# Altium footprint library Switches.PcbLib: 117 footprints (part 7 of 8) (continued)
## SW_OMRON_A6SN-1101 [mm] "Body 4.48x7.5mm, 1 Way SPST Surface-Mounting Slide Switch With Flat Actuator (A6SN Series)"
height 4.6
pads (2):
  rect 2.15x1.1 smd: 1(-4.125,0) 2(4.125,0)
Top Overlay:
  lines w0.2: -3.75,-0.95 -3.75,-2.49 3.75,-2.49 3.75,-0.95 ; -3.75,0.95 -3.75,2.49 3.75,2.49 3.75,0.95 ; -1.578,-1.05 -1.578,1.05 ; -1.378,-1.05 -1.378,1.05 ; -1.178,-1.05 -1.178,1.05 ; -0.978,-1.05 -0.978,1.05 ; -0.778,-1.05 -0.778,1.05 ; -0.578,-1.05 -0.578,1.05 ; -0.378,-1.05 -0.378,1.05 ; -0.178,-1.05 -0.178,1.05 ; -0.025,-1.05 -0.025,1.05 ; -2.225,-1.05 2.225,-1.05 2.225,1.05 -2.225,1.05 -2.225,-1.05
Mechanical 8:
  lines w0.1: -4.625,0 -4.125,0 ; -4.125,-0.5 -4.125,0 ; -4.125,0.5 -4.125,0 ; -3.625,0 -4.125,0 ; -0.5,0 0,0 ; 0,-0.5 0,0 ; 0,0.5 0,0 ; 0.5,0 0,0 ; 3.625,0 4.125,0 ; 4.125,-0.5 4.125,0 ; 4.125,0.5 4.125,0 ; 4.625,0 4.125,0 ; -5.2,-0.55 -3.05,-0.55 -3.05,0.55 -5.2,0.55 -5.2,-0.55 ; 3.05,-0.55 5.2,-0.55 5.2,0.55 3.05,0.55 3.05,-0.55
Mechanical 14:
  lines w0.1: -3.75,-0.8 -4.226,-0.8 -4.25,-0.3 -4.65,-0.3 -4.65,0.3 -4.25,0.3 -4.226,0.8 -3.75,0.8 ; -1.578,-1.05 -1.578,1.05 ; -1.478,-1.05 -1.478,1.05 ; -1.378,-1.05 -1.378,1.05 ; -1.278,-1.05 -1.278,1.05 ; -1.178,-1.05 -1.178,1.05 ; -1.078,-1.05 -1.078,1.05 ; -0.978,-1.05 -0.978,1.05 ; -0.878,-1.05 -0.878,1.05 ; -0.778,-1.05 -0.778,1.05 ; -0.678,-1.05 -0.678,1.05 ; -0.578,-1.05 -0.578,1.05 ; -0.478,-1.05 -0.478,1.05 ; -0.378,-1.05 -0.378,1.05 ; -0.278,-1.05 -0.278,1.05 ; -0.178,-1.05 -0.178,1.05 ; -0.078,-1.05 -0.078,1.05 ; -0.025,-1.05 -0.025,1.05 ; 3.75,-0.8 4.226,-0.8 4.25,-0.3 4.65,-0.3 4.65,0.3 4.25,0.3 4.226,0.8 3.75,0.8 ; 3.75,0.55 4.226,0.55 ; -3.75,-2.49 -3.75,2.49 3.75,2.49 3.75,-2.49 -3.75,-2.49 ; -2.225,-1.05 -2.225,1.05 2.225,1.05 2.225,-1.05 -2.225,-1.05
  text "ON" at 2.54,0.889 h1
Mechanical 15:
  lines w0.05: -5.45,-1.05 -4,-1.05 -4,-2.74 4,-2.74 4,-1.05 5.45,-1.05 5.45,1.05 4,1.05 4,2.74 -4,2.74 -4,1.05 -5.45,1.05 -5.45,-1.05
3D body "SW_OMRON_A6SN-1101.stp": height 4.6, standoff 0, extent -4.65,-2.49 4.65,2.49

## SW_OMRON_A6SN-2101 [mm] "Pitch 2.54mm, Body 7x7.5, 2 Ways SPST Surface-Mounting Slide Switch With Flat Actuator (A6SN Series)"
height 4.6
pads (4):
  rect 2.15x1.1 smd: 1(-4.125,1.27) 2(-4.125,-1.27) 3(4.125,-1.27) 4(4.125,1.27)
Top Overlay:
  lines w0.2: -3.75,-2.22 -3.75,-3.76 3.75,-3.76 3.75,-2.22 ; -3.75,2.22 -3.75,3.76 3.75,3.76 3.75,2.22 ; -1.578,-2.32 -1.578,-0.22 ; -1.578,0.22 -1.578,2.32 ; -1.378,-2.32 -1.378,-0.22 ; -1.378,0.22 -1.378,2.32 ; -1.178,-2.32 -1.178,-0.22 ; -1.178,0.22 -1.178,2.32 ; -0.978,-2.32 -0.978,-0.22 ; -0.978,0.22 -0.978,2.32 ; -0.778,-2.32 -0.778,-0.22 ; -0.778,0.22 -0.778,2.32 ; -0.578,-2.32 -0.578,-0.22 ; -0.578,0.22 -0.578,2.32 ; -0.378,-2.32 -0.378,-0.22 ; -0.378,0.22 -0.378,2.32 ; -0.178,-2.32 -0.178,-0.22 ; -0.178,0.22 -0.178,2.32 ; -0.025,-2.32 -0.025,-0.22 ; -0.025,0.22 -0.025,2.32 ; -2.225,-2.32 2.225,-2.32 2.225,-0.22 -2.225,-0.22 -2.225,-2.32 ; -2.225,0.22 2.225,0.22 2.225,2.32 -2.225,2.32 -2.225,0.22
  text "1" at -3.175,3.175 h1
  text "2" at -3.175,-2.699 h1
Mechanical 8:
  lines w0.05: -4.625,-1.27 -4.125,-1.27 ; -4.625,1.27 -4.125,1.27 ; -4.125,-1.77 -4.125,-1.27 ; -4.125,-0.77 -4.125,-1.27 ; -4.125,0.77 -4.125,1.27 ; -4.125,1.77 -4.125,1.27 ; -3.625,-1.27 -4.125,-1.27 ; -3.625,1.27 -4.125,1.27 ; -0.5,-1.27 0,-1.27 ; -0.5,0 0,0 ; -0.5,1.27 0,1.27 ; 0,-1.77 0,-1.27 ; 0,-0.77 0,-1.27 ; 0,-0.5 0,0 ; 0,0.5 0,0 ; 0,0.77 0,1.27 ; 0,1.77 0,1.27 ; 0.5,-1.27 0,-1.27 ; 0.5,0 0,0 ; 0.5,1.27 0,1.27 ; 3.625,-1.27 4.125,-1.27 ; 3.625,1.27 4.125,1.27 ; 4.125,-1.77 4.125,-1.27 ; 4.125,-0.77 4.125,-1.27 ; 4.125,0.77 4.125,1.27 ; 4.125,1.77 4.125,1.27 ; 4.625,-1.27 4.125,-1.27 ; 4.625,1.27 4.125,1.27 ; -5.2,-1.82 -5.2,-0.72 -3.05,-0.72 -3.05,-1.82 -5.2,-1.82 ; -5.2,0.72 -5.2,1.82 -3.05,1.82 -3.05,0.72 -5.2,0.72 ; 3.05,-1.82 3.05,-0.72 5.2,-0.72 5.2,-1.82 3.05,-1.82 ; 3.05,0.72 3.05,1.82 5.2,1.82 5.2,0.72 3.05,0.72
Mechanical 14:
  lines w0.1: -3.75,-2.07 -4.226,-2.07 -4.25,-1.57 -4.65,-1.57 -4.65,-0.97 -4.25,-0.97 -4.226,-0.47 -3.75,-0.47 ; -3.75,0.47 -4.226,0.47 -4.25,0.97 -4.65,0.97 -4.65,1.57 -4.25,1.57 -4.226,2.07 -3.75,2.07 ; -1.578,-2.32 -1.578,-0.22 ; -1.578,0.22 -1.578,2.32 ; -1.478,-2.32 -1.478,-0.22 ; -1.478,0.22 -1.478,2.32 ; -1.378,-2.32 -1.378,-0.22 ; -1.378,0.22 -1.378,2.32 ; -1.278,-2.32 -1.278,-0.22 ; -1.278,0.22 -1.278,2.32 ; -1.178,-2.32 -1.178,-0.22 ; -1.178,0.22 -1.178,2.32 ; -1.078,-2.32 -1.078,-0.22 ; -1.078,0.22 -1.078,2.32 ; -0.978,-2.32 -0.978,-0.22 ; -0.978,0.22 -0.978,2.32 ; -0.878,-2.32 -0.878,-0.22 ; -0.878,0.22 -0.878,2.32 ; -0.778,-2.32 -0.778,-0.22 ; -0.778,0.22 -0.778,2.32 ; -0.678,-2.32 -0.678,-0.22 ; -0.678,0.22 -0.678,2.32 ; -0.578,-2.32 -0.578,-0.22 ; -0.578,0.22 -0.578,2.32 ; -0.478,-2.32 -0.478,-0.22 ; -0.478,0.22 -0.478,2.32 ; -0.378,-2.32 -0.378,-0.22 ; -0.378,0.22 -0.378,2.32 ; -0.278,-2.32 -0.278,-0.22 ; -0.278,0.22 -0.278,2.32 ; -0.178,-2.32 -0.178,-0.22 ; -0.178,0.22 -0.178,2.32 ; -0.078,-2.32 -0.078,-0.22 ; -0.078,0.22 -0.078,2.32 ; -0.025,-2.32 -0.025,-0.22 ; -0.025,0.22 -0.025,2.32 ; 3.75,-2.07 4.226,-2.07 4.25,-1.57 4.65,-1.57 4.65,-0.97 4.25,-0.97 4.226,-0.47 3.75,-0.47 ; 3.75,-0.72 4.226,-0.72 ; 3.75,0.47 4.226,0.47 4.25,0.97 4.65,0.97 4.65,1.57 4.25,1.57 4.226,2.07 3.75,2.07 ; 3.75,1.82 4.226,1.82 ; -3.75,-3.76 3.75,-3.76 3.75,3.76 -3.75,3.76 -3.75,-3.76 ; -2.225,-2.32 2.225,-2.32 2.225,-0.22 -2.225,-0.22 -2.225,-2.32 ; -2.225,0.22 2.225,0.22 2.225,2.32 -2.225,2.32 -2.225,0.22
  text "1" at -3.175,3.175 h1
  text "2" at -3.175,-2.699 h1
Mechanical 15:
  lines w0.05: -5.45,-2.32 -5.45,2.32 -4,2.32 -4,4.01 4,4.01 4,2.32 5.45,2.32 5.45,-2.32 4,-2.32 4,-4.01 -4,-4.01 -4,-2.32 -5.45,-2.32
3D body "SW_OMRON_A6SN-2101.stp": height 4.6, standoff 0, extent -4.65,-3.76 4.65,3.76

## SW_OMRON_A6SN-3101 [mm] "Pitch 2.54mm, Body 9.6x7.5, 3 Ways SPST Surface-Mounting Slide Switch With Flat Actuator (A6SN Series)witch With Flat Actuator (A6SN Series)"
height 4.6
pads (6):
  rect 2.15x1.1 smd: 1(-4.125,2.54) 2(-4.125,0) 3(-4.125,-2.54) 4(4.125,-2.54) 5(4.125,0) 6(4.125,2.54)
Top Overlay:
  lines w0.2: -3.75,-3.49 -3.75,-5.03 3.75,-5.03 3.75,-3.49 ; -3.75,3.49 -3.75,5.03 3.75,5.03 3.75,3.49 ; -1.578,-3.59 -1.578,-1.49 ; -1.578,-1.05 -1.578,1.05 ; -1.578,1.49 -1.578,3.59 ; -1.378,-3.59 -1.378,-1.49 ; -1.378,-1.05 -1.378,1.05 ; -1.378,1.49 -1.378,3.59 ; -1.178,-3.59 -1.178,-1.49 ; -1.178,-1.05 -1.178,1.05 ; -1.178,1.49 -1.178,3.59 ; -0.978,-3.59 -0.978,-1.49 ; -0.978,-1.05 -0.978,1.05 ; -0.978,1.49 -0.978,3.59 ; -0.778,-3.59 -0.778,-1.49 ; -0.778,-1.05 -0.778,1.05 ; -0.778,1.49 -0.778,3.59 ; -0.578,-3.59 -0.578,-1.49 ; -0.578,-1.05 -0.578,1.05 ; -0.578,1.49 -0.578,3.59 ; -0.378,-3.59 -0.378,-1.49 ; -0.378,-1.05 -0.378,1.05 ; -0.378,1.49 -0.378,3.59 ; -0.178,-3.59 -0.178,-1.49 ; -0.178,-1.05 -0.178,1.05 ; -0.178,1.49 -0.178,3.59 ; -0.025,-3.59 -0.025,-1.49 ; -0.025,-1.05 -0.025,1.05 ; -0.025,1.49 -0.025,3.59 ; -2.225,-3.59 -2.225,-1.49 2.225,-1.49 2.225,-3.59 -2.225,-3.59 ; -2.225,-1.05 -2.225,1.05 2.225,1.05 2.225,-1.05 -2.225,-1.05 ; -2.225,1.49 -2.225,3.59 2.225,3.59 2.225,1.49 -2.225,1.49
  text "1" at -3.175,4.445 h1
  text "3" at -3.175,-3.969 h1
Mechanical 8:
  lines w0.05: -4.625,-2.54 -4.125,-2.54 ; -4.625,0 -4.125,0 ; -4.625,2.54 -4.125,2.54 ; -4.125,-3.04 -4.125,-2.54 ; -4.125,-2.04 -4.125,-2.54 ; -4.125,-0.5 -4.125,0 ; -4.125,0.5 -4.125,0 ; -4.125,2.04 -4.125,2.54 ; -4.125,3.04 -4.125,2.54 ; -3.625,-2.54 -4.125,-2.54 ; -3.625,0 -4.125,0 ; -3.625,2.54 -4.125,2.54 ; -0.5,-2.54 0,-2.54 ; -0.5,0 0,0 ; -0.5,2.54 0,2.54 ; 0,-3.04 0,-2.54 ; 0,-2.04 0,-2.54 ; 0,-0.5 0,0 ; 0,0.5 0,0 ; 0,2.04 0,2.54 ; 0,3.04 0,2.54 ; 0.5,-2.54 0,-2.54 ; 0.5,0 0,0 ; 0.5,2.54 0,2.54 ; 3.625,-2.54 4.125,-2.54 ; 3.625,0 4.125,0 ; 3.625,2.54 4.125,2.54 ; 4.125,-3.04 4.125,-2.54 ; 4.125,-2.04 4.125,-2.54 ; 4.125,-0.5 4.125,0 ; 4.125,0.5 4.125,0 ; 4.125,2.04 4.125,2.54 ; 4.125,3.04 4.125,2.54 ; 4.625,-2.54 4.125,-2.54 ; 4.625,0 4.125,0 ; 4.625,2.54 4.125,2.54 ; -5.2,-3.09 -3.05,-3.09 -3.05,-1.99 -5.2,-1.99 -5.2,-3.09 ; -5.2,-0.55 -3.05,-0.55 -3.05,0.55 -5.2,0.55 -5.2,-0.55 ; -5.2,1.99 -3.05,1.99 -3.05,3.09 -5.2,3.09 -5.2,1.99 ; 3.05,-3.09 5.2,-3.09 5.2,-1.99 3.05,-1.99 3.05,-3.09 ; 3.05,-0.55 5.2,-0.55 5.2,0.55 3.05,0.55 3.05,-0.55 ; 3.05,1.99 5.2,1.99 5.2,3.09 3.05,3.09 3.05,1.99
Mechanical 14:
  lines w0.1: -3.75,-3.34 -4.226,-3.34 -4.25,-2.84 -4.65,-2.84 -4.65,-2.24 -4.25,-2.24 -4.226,-1.74 -3.75,-1.74 ; -3.75,-0.8 -4.226,-0.8 -4.25,-0.3 -4.65,-0.3 -4.65,0.3 -4.25,0.3 -4.226,0.8 -3.75,0.8 ; -3.75,1.74 -4.226,1.74 -4.25,2.24 -4.65,2.24 -4.65,2.84 -4.25,2.84 -4.226,3.34 -3.75,3.34 ; -1.578,-3.59 -1.578,-1.49 ; -1.578,-1.05 -1.578,1.05 ; -1.578,1.49 -1.578,3.59 ; -1.478,-3.59 -1.478,-1.49 ; -1.478,-1.05 -1.478,1.05 ; -1.478,1.49 -1.478,3.59 ; -1.378,-3.59 -1.378,-1.49 ; -1.378,-1.05 -1.378,1.05 ; -1.378,1.49 -1.378,3.59 ; -1.278,-3.59 -1.278,-1.49 ; -1.278,-1.05 -1.278,1.05 ; -1.278,1.49 -1.278,3.59 ; -1.178,-3.59 -1.178,-1.49 ; -1.178,-1.05 -1.178,1.05 ; -1.178,1.49 -1.178,3.59 ; -1.078,-3.59 -1.078,-1.49 ; -1.078,-1.05 -1.078,1.05 ; -1.078,1.49 -1.078,3.59 ; -0.978,-3.59 -0.978,-1.49 ; -0.978,-1.05 -0.978,1.05 ; -0.978,1.49 -0.978,3.59 ; -0.878,-3.59 -0.878,-1.49 ; -0.878,-1.05 -0.878,1.05 ; -0.878,1.49 -0.878,3.59 ; -0.778,-3.59 -0.778,-1.49 ; -0.778,-1.05 -0.778,1.05 ; -0.778,1.49 -0.778,3.59 ; -0.678,-3.59 -0.678,-1.49 ; -0.678,-1.05 -0.678,1.05 ; -0.678,1.49 -0.678,3.59 ; -0.578,-3.59 -0.578,-1.49 ; -0.578,-1.05 -0.578,1.05 ; -0.578,1.49 -0.578,3.59 ; -0.478,-3.59 -0.478,-1.49 ; -0.478,-1.05 -0.478,1.05 ; -0.478,1.49 -0.478,3.59 ; -0.378,-3.59 -0.378,-1.49 ; -0.378,-1.05 -0.378,1.05 ; -0.378,1.49 -0.378,3.59 ; -0.278,-3.59 -0.278,-1.49 ; -0.278,-1.05 -0.278,1.05 ; -0.278,1.49 -0.278,3.59 ; -0.178,-3.59 -0.178,-1.49 ; -0.178,-1.05 -0.178,1.05 ; -0.178,1.49 -0.178,3.59 ; -0.078,-3.59 -0.078,-1.49 ; -0.078,-1.05 -0.078,1.05 ; -0.078,1.49 -0.078,3.59 ; -0.025,-3.59 -0.025,-1.49 ; -0.025,-1.05 -0.025,1.05 ; -0.025,1.49 -0.025,3.59 ; 3.75,-3.34 4.226,-3.34 4.25,-2.84 4.65,-2.84 4.65,-2.24 4.25,-2.24 4.226,-1.74 3.75,-1.74 ; 3.75,-1.99 4.226,-1.99 ; 3.75,-0.8 4.226,-0.8 4.25,-0.3 4.65,-0.3 4.65,0.3 4.25,0.3 4.226,0.8 3.75,0.8 ; 3.75,0.55 4.226,0.55 ; 3.75,1.74 4.226,1.74 4.25,2.24 4.65,2.24 4.65,2.84 4.25,2.84 4.226,3.34 3.75,3.34 ; 3.75,3.09 4.226,3.09 ; -3.75,-5.03 -3.75,5.03 3.75,5.03 3.75,-5.03 -3.75,-5.03 ; -2.225,-3.59 -2.225,-1.49 2.225,-1.49 2.225,-3.59 -2.225,-3.59 ; -2.225,-1.05 -2.225,1.05 2.225,1.05 2.225,-1.05 -2.225,-1.05 ; -2.225,1.49 -2.225,3.59 2.225,3.59 2.225,1.49 -2.225,1.49
  text "1" at -3.175,4.445 h1
  text "3" at -3.175,-3.969 h1
Mechanical 15:
  lines w0.05: -5.45,-3.59 -4,-3.59 -4,-5.28 4,-5.28 4,-3.59 5.45,-3.59 5.45,3.59 4,3.59 4,5.28 -4,5.28 -4,3.59 -5.45,3.59 -5.45,-3.59
3D body "SW_OMRON_A6SN-3101.stp": height 4.6, standoff 0, extent -4.65,-5.03 4.65,5.03

## SW_OMRON_A6SN-4101 [mm] "Pitch 2.54mm, Body 9.6x7.5, 3 Ways SPST Surface-Mounting Slide Switch With Flat Actuator (A6SN Series)witch With Flat Actuator (A6SN Series)"
height 4.6
pads (8):
  rect 2.15x1.1 smd: 1(-4.125,3.81) 2(-4.125,1.27) 3(-4.125,-1.27) 4(-4.125,-3.81) 5(4.125,-3.81) 6(4.125,-1.27) 7(4.125,1.27) 8(4.125,3.81)
Top Overlay:
  lines w0.2: -3.75,-4.76 -3.75,-6.3 3.75,-6.3 3.75,-4.76 ; -3.75,4.76 -3.75,6.3 3.75,6.3 3.75,4.76 ; -1.578,-4.86 -1.578,-2.76 ; -1.578,-2.32 -1.578,-0.22 ; -1.578,0.22 -1.578,2.32 ; -1.578,2.76 -1.578,4.86 ; -1.378,-4.86 -1.378,-2.76 ; -1.378,-2.32 -1.378,-0.22 ; -1.378,0.22 -1.378,2.32 ; -1.378,2.76 -1.378,4.86 ; -1.178,-4.86 -1.178,-2.76 ; -1.178,-2.32 -1.178,-0.22 ; -1.178,0.22 -1.178,2.32 ; -1.178,2.76 -1.178,4.86 ; -0.978,-4.86 -0.978,-2.76 ; -0.978,-2.32 -0.978,-0.22 ; -0.978,0.22 -0.978,2.32 ; -0.978,2.76 -0.978,4.86 ; -0.778,-4.86 -0.778,-2.76 ; -0.778,-2.32 -0.778,-0.22 ; -0.778,0.22 -0.778,2.32 ; -0.778,2.76 -0.778,4.86 ; -0.578,-4.86 -0.578,-2.76 ; -0.578,-2.32 -0.578,-0.22 ; -0.578,0.22 -0.578,2.32 ; -0.578,2.76 -0.578,4.86 ; -0.378,-4.86 -0.378,-2.76 ; -0.378,-2.32 -0.378,-0.22 ; -0.378,0.22 -0.378,2.32 ; -0.378,2.76 -0.378,4.86 ; -0.178,-4.86 -0.178,-2.76 ; -0.178,-2.32 -0.178,-0.22 ; -0.178,0.22 -0.178,2.32 ; -0.178,2.76 -0.178,4.86 ; -0.025,-4.86 -0.025,-2.76 ; -0.025,-2.32 -0.025,-0.22 ; -0.025,0.22 -0.025,2.32 ; -0.025,2.76 -0.025,4.86 ; -2.225,-4.86 2.225,-4.86 2.225,-2.76 -2.225,-2.76 -2.225,-4.86 ; -2.225,-2.32 -2.225,-0.22 2.225,-0.22 2.225,-2.32 -2.225,-2.32 ; -2.225,0.22 2.225,0.22 2.225,2.32 -2.225,2.32 -2.225,0.22 ; -2.225,2.76 2.225,2.76 2.225,4.86 -2.225,4.86 -2.225,2.76
  text "4" at -3.175,-5.239 h1
  text "1" at -3.175,5.715 h1
Mechanical 8:
  lines w0.05: -4.625,-3.81 -4.125,-3.81 ; -4.625,-1.27 -4.125,-1.27 ; -4.625,1.27 -4.125,1.27 ; -4.625,3.81 -4.125,3.81 ; -4.125,-4.31 -4.125,-3.81 ; -4.125,-3.31 -4.125,-3.81 ; -4.125,-1.77 -4.125,-1.27 ; -4.125,-0.77 -4.125,-1.27 ; -4.125,0.77 -4.125,1.27 ; -4.125,1.77 -4.125,1.27 ; -4.125,3.31 -4.125,3.81 ; -4.125,4.31 -4.125,3.81 ; -3.625,-3.81 -4.125,-3.81 ; -3.625,-1.27 -4.125,-1.27 ; -3.625,1.27 -4.125,1.27 ; -3.625,3.81 -4.125,3.81 ; -0.5,-3.81 0,-3.81 ; -0.5,-1.27 0,-1.27 ; -0.5,1.27 0,1.27 ; -0.5,3.81 0,3.81 ; 0,-4.31 0,-3.81 ; 0,-3.31 0,-3.81 ; 0,-1.77 0,-1.27 ; 0,-0.77 0,-1.27 ; 0,0.77 0,1.27 ; 0,1.77 0,1.27 ; 0,3.31 0,3.81 ; 0,4.31 0,3.81 ; 0.5,-3.81 0,-3.81 ; 0.5,-1.27 0,-1.27 ; 0.5,1.27 0,1.27 ; 0.5,3.81 0,3.81 ; 3.625,-3.81 4.125,-3.81 ; 3.625,-1.27 4.125,-1.27 ; 3.625,1.27 4.125,1.27 ; 3.625,3.81 4.125,3.81 ; 4.125,-4.31 4.125,-3.81 ; 4.125,-3.31 4.125,-3.81 ; 4.125,-1.77 4.125,-1.27 ; 4.125,-0.77 4.125,-1.27 ; 4.125,0.77 4.125,1.27 ; 4.125,1.77 4.125,1.27 ; 4.125,3.31 4.125,3.81 ; 4.125,4.31 4.125,3.81 ; 4.625,-3.81 4.125,-3.81 ; 4.625,-1.27 4.125,-1.27 ; 4.625,1.27 4.125,1.27 ; 4.625,3.81 4.125,3.81 ; -5.2,-4.36 -5.2,-3.26 -3.05,-3.26 -3.05,-4.36 -5.2,-4.36 ; -5.2,-1.82 -3.05,-1.82 -3.05,-0.72 -5.2,-0.72 -5.2,-1.82 ; -5.2,0.72 -5.2,1.82 -3.05,1.82 -3.05,0.72 -5.2,0.72 ; -5.2,3.26 -5.2,4.36 -3.05,4.36 -3.05,3.26 -5.2,3.26 ; 3.05,-4.36 3.05,-3.26 5.2,-3.26 5.2,-4.36 3.05,-4.36 ; 3.05,-1.82 5.2,-1.82 5.2,-0.72 3.05,-0.72 3.05,-1.82 ; 3.05,0.72 3.05,1.82 5.2,1.82 5.2,0.72 3.05,0.72 ; 3.05,3.26 3.05,4.36 5.2,4.36 5.2,3.26 3.05,3.26
Mechanical 14:
  lines w0.1: -3.75,-6.3 3.75,-6.3 ; -3.75,-4.61 -4.226,-4.61 -4.25,-4.11 -4.65,-4.11 -4.65,-3.51 -4.25,-3.51 -4.226,-3.01 -3.75,-3.01 ; -3.75,-3.76 -3.75,6.3 3.75,6.3 3.75,-3.76 ; -3.75,-2.07 -4.226,-2.07 -4.25,-1.57 -4.65,-1.57 -4.65,-0.97 -4.25,-0.97 -4.226,-0.47 -3.75,-0.47 ; -3.75,0.47 -4.226,0.47 -4.25,0.97 -4.65,0.97 -4.65,1.57 -4.25,1.57 -4.226,2.07 -3.75,2.07 ; -3.75,3.01 -4.226,3.01 -4.25,3.51 -4.65,3.51 -4.65,4.11 -4.25,4.11 -4.226,4.61 -3.75,4.61 ; -1.578,-4.86 -1.578,-2.76 ; -1.578,-2.32 -1.578,-0.22 ; -1.578,0.22 -1.578,2.32 ; -1.578,2.76 -1.578,4.86 ; -1.478,-4.86 -1.478,-2.76 ; -1.478,-2.32 -1.478,-0.22 ; -1.478,0.22 -1.478,2.32 ; -1.478,2.76 -1.478,4.86 ; -1.378,-4.86 -1.378,-2.76 ; -1.378,-2.32 -1.378,-0.22 ; -1.378,0.22 -1.378,2.32 ; -1.378,2.76 -1.378,4.86 ; -1.278,-4.86 -1.278,-2.76 ; -1.278,-2.32 -1.278,-0.22 ; -1.278,0.22 -1.278,2.32 ; -1.278,2.76 -1.278,4.86 ; -1.178,-4.86 -1.178,-2.76 ; -1.178,-2.32 -1.178,-0.22 ; -1.178,0.22 -1.178,2.32 ; -1.178,2.76 -1.178,4.86 ; -1.078,-4.86 -1.078,-2.76 ; -1.078,-2.32 -1.078,-0.22 ; -1.078,0.22 -1.078,2.32 ; -1.078,2.76 -1.078,4.86 ; -0.978,-4.86 -0.978,-2.76 ; -0.978,-2.32 -0.978,-0.22 ; -0.978,0.22 -0.978,2.32 ; -0.978,2.76 -0.978,4.86 ; -0.878,-4.86 -0.878,-2.76 ; -0.878,-2.32 -0.878,-0.22 ; -0.878,0.22 -0.878,2.32 ; -0.878,2.76 -0.878,4.86 ; -0.778,-4.86 -0.778,-2.76 ; -0.778,-2.32 -0.778,-0.22 ; -0.778,0.22 -0.778,2.32 ; -0.778,2.76 -0.778,4.86 ; -0.678,-4.86 -0.678,-2.76 ; -0.678,-2.32 -0.678,-0.22 ; -0.678,0.22 -0.678,2.32 ; -0.678,2.76 -0.678,4.86 ; -0.578,-4.86 -0.578,-2.76 ; -0.578,-2.32 -0.578,-0.22 ; -0.578,0.22 -0.578,2.32 ; -0.578,2.76 -0.578,4.86 ; -0.478,-4.86 -0.478,-2.76 ; -0.478,-2.32 -0.478,-0.22 ; -0.478,0.22 -0.478,2.32 ; -0.478,2.76 -0.478,4.86 ; -0.378,-4.86 -0.378,-2.76 ; -0.378,-2.32 -0.378,-0.22 ; -0.378,0.22 -0.378,2.32 ; -0.378,2.76 -0.378,4.86 ; -0.278,-4.86 -0.278,-2.76 ; -0.278,-2.32 -0.278,-0.22 ; -0.278,0.22 -0.278,2.32 ; -0.278,2.76 -0.278,4.86 ; -0.178,-4.86 -0.178,-2.76 ; -0.178,-2.32 -0.178,-0.22 ; -0.178,0.22 -0.178,2.32 ; -0.178,2.76 -0.178,4.86 ; -0.078,-4.86 -0.078,-2.76 ; -0.078,-2.32 -0.078,-0.22 ; -0.078,0.22 -0.078,2.32 ; -0.078,2.76 -0.078,4.86 ; -0.025,-4.86 -0.025,-2.76 ; -0.025,-2.32 -0.025,-0.22 ; -0.025,0.22 -0.025,2.32 ; -0.025,2.76 -0.025,4.86 ; 3.75,-4.61 4.226,-4.61 4.25,-4.11 4.65,-4.11 4.65,-3.51 4.25,-3.51 4.226,-3.01 3.75,-3.01 ; 3.75,-3.26 4.226,-3.26 ; 3.75,-2.07 4.226,-2.07 4.25,-1.57 4.65,-1.57 4.65,-0.97 4.25,-0.97 4.226,-0.47 3.75,-0.47 ; 3.75,-0.72 4.226,-0.72 ; 3.75,0.47 4.226,0.47 4.25,0.97 4.65,0.97 4.65,1.57 4.25,1.57 4.226,2.07 3.75,2.07 ; 3.75,1.82 4.226,1.82 ; 3.75,3.01 4.226,3.01 4.25,3.51 4.65,3.51 4.65,4.11 4.25,4.11 4.226,4.61 3.75,4.61 ; 3.75,4.36 4.226,4.36 ; -2.225,-4.86 2.225,-4.86 2.225,-2.76 -2.225,-2.76 -2.225,-4.86 ; -2.225,-2.32 -2.225,-0.22 2.225,-0.22 2.225,-2.32 -2.225,-2.32 ; -2.225,0.22 2.225,0.22 2.225,2.32 -2.225,2.32 -2.225,0.22 ; -2.225,2.76 2.225,2.76 2.225,4.86 -2.225,4.86 -2.225,2.76
  text "4" at -3.175,-5.239 h1
  text "1" at -3.175,5.715 h1
Mechanical 15:
  lines w0.05: -5.45,-4.86 -5.45,4.86 -4,4.86 -4,6.55 4,6.55 4,4.86 5.45,4.86 5.45,-4.86 4,-4.86 4,-6.55 -4,-6.55 -4,-4.86 -5.45,-4.86
3D body "SW_OMRON_A6SN-4101.stp": height 4.6, standoff 0, extent -4.65,-6.3 4.65,6.3

## SW_OMRON_A6SN-8101 [mm] "Pitch 2.54mm, Body 22.3x7.5, 8 Ways SPST Surface-Mounting Slide Switch With Flat Actuator (A6SN Series)"
height 4.6
pads (16):
  rect 2.15x1.1 smd: 1(-4.125,8.89) 2(-4.125,6.35) 3(-4.125,3.81) 4(-4.125,1.27) 5(-4.125,-1.27) 6(-4.125,-3.81) 7(-4.125,-6.35) 8(-4.125,-8.89) 9(4.125,-8.89) 10(4.125,-6.35) 11(4.125,-3.81) 12(4.125,-1.27) 13(4.125,1.27) 14(4.125,3.81) 15(4.125,6.35) 16(4.125,8.89)
Top Overlay:
  lines w0.2: -3.75,-9.84 -3.75,-11.38 3.75,-11.38 3.75,-9.84 ; -3.75,9.84 -3.75,11.38 3.75,11.38 3.75,9.84 ; -1.578,-9.94 -1.578,-7.84 ; -1.578,-7.4 -1.578,-5.3 ; -1.578,-4.86 -1.578,-2.76 ; -1.578,-2.32 -1.578,-0.22 ; -1.578,0.22 -1.578,2.32 ; -1.578,2.76 -1.578,4.86 ; -1.578,5.3 -1.578,7.4 ; -1.578,7.84 -1.578,9.94 ; -1.378,-9.94 -1.378,-7.84 ; -1.378,-7.4 -1.378,-5.3 ; -1.378,-4.86 -1.378,-2.76 ; -1.378,-2.32 -1.378,-0.22 ; -1.378,0.22 -1.378,2.32 ; -1.378,2.76 -1.378,4.86 ; -1.378,5.3 -1.378,7.4 ; -1.378,7.84 -1.378,9.94 ; -1.178,-9.94 -1.178,-7.84 ; -1.178,-7.4 -1.178,-5.3 ; -1.178,-4.86 -1.178,-2.76 ; -1.178,-2.32 -1.178,-0.22 ; -1.178,0.22 -1.178,2.32 ; -1.178,2.76 -1.178,4.86 ; -1.178,5.3 -1.178,7.4 ; -1.178,7.84 -1.178,9.94 ; -0.978,-9.94 -0.978,-7.84 ; -0.978,-7.4 -0.978,-5.3 ; -0.978,-4.86 -0.978,-2.76 ; -0.978,-2.32 -0.978,-0.22 ; -0.978,0.22 -0.978,2.32 ; -0.978,2.76 -0.978,4.86 ; -0.978,5.3 -0.978,7.4 ; -0.978,7.84 -0.978,9.94 ; -0.778,-9.94 -0.778,-7.84 ; -0.778,-7.4 -0.778,-5.3 ; -0.778,-4.86 -0.778,-2.76 ; -0.778,-2.32 -0.778,-0.22 ; -0.778,0.22 -0.778,2.32 ; -0.778,2.76 -0.778,4.86 ; -0.778,5.3 -0.778,7.4 ; -0.778,7.84 -0.778,9.94 ; -0.578,-9.94 -0.578,-7.84 ; -0.578,-7.4 -0.578,-5.3 ; -0.578,-4.86 -0.578,-2.76 ; -0.578,-2.32 -0.578,-0.22 ; -0.578,0.22 -0.578,2.32 ; -0.578,2.76 -0.578,4.86 ; -0.578,5.3 -0.578,7.4 ; -0.578,7.84 -0.578,9.94 ; -0.378,-9.94 -0.378,-7.84 ; -0.378,-7.4 -0.378,-5.3 ; -0.378,-4.86 -0.378,-2.76 ; -0.378,-2.32 -0.378,-0.22 ; -0.378,0.22 -0.378,2.32 ; -0.378,2.76 -0.378,4.86 ; -0.378,5.3 -0.378,7.4 ; -0.378,7.84 -0.378,9.94 ; -0.178,-9.94 -0.178,-7.84 ; -0.178,-7.4 -0.178,-5.3 ; -0.178,-4.86 -0.178,-2.76 ; -0.178,-2.32 -0.178,-0.22 ; -0.178,0.22 -0.178,2.32 ; -0.178,2.76 -0.178,4.86 ; -0.178,5.3 -0.178,7.4 ; -0.178,7.84 -0.178,9.94 ; -0.025,-9.94 -0.025,-7.84 ; -0.025,-7.4 -0.025,-5.3 ; -0.025,-4.86 -0.025,-2.76 ; -0.025,-2.32 -0.025,-0.22 ; -0.025,0.22 -0.025,2.32 ; -0.025,2.76 -0.025,4.86 ; -0.025,5.3 -0.025,7.4 ; -0.025,7.84 -0.025,9.94 ; -2.225,-9.94 2.225,-9.94 2.225,-7.84 -2.225,-7.84 -2.225,-9.94 ; -2.225,-7.4 2.225,-7.4 2.225,-5.3 -2.225,-5.3 -2.225,-7.4 ; -2.225,-4.86 2.225,-4.86 2.225,-2.76 -2.225,-2.76 -2.225,-4.86 ; -2.225,-2.32 2.225,-2.32 2.225,-0.22 -2.225,-0.22 -2.225,-2.32 ; -2.225,0.22 2.225,0.22 2.225,2.32 -2.225,2.32 -2.225,0.22 ; -2.225,2.76 2.225,2.76 2.225,4.86 -2.225,4.86 -2.225,2.76 ; -2.225,5.3 2.225,5.3 2.225,7.4 -2.225,7.4 -2.225,5.3 ; -2.225,7.84 2.225,7.84 2.225,9.94 -2.225,9.94 -2.225,7.84
Mechanical 8:
  drawing of 164 lines, arcs and shapes, not listed
Mechanical 14:
  drawing of 292 lines, arcs and shapes, not listed
Mechanical 15:
  lines w0.05: -5.45,-9.94 -4,-9.94 -4,-11.63 4,-11.63 4,-9.94 5.45,-9.94 5.45,9.94 4,9.94 4,11.63 -4,11.63 -4,9.94 -5.45,9.94 -5.45,-9.94
3D body "SW_OMRON_A6SN-8101.stp": height 4.6, standoff 0, extent -4.65,-11.38 4.65,11.38

## SW_OMRON_A9T21-0014 [mm] "Body 8.4x5.6mm, DPDT Switch With Bracket Mounting, OMRON A9T Series"
height 20.6
pads (10):
  round 1.5 hole 0.8: 1(-1.27,-2.54) 2(-1.27,0) 3(-1.27,2.54) 4(1.27,-2.54) 5(1.27,0) 6(1.27,2.54) 7(-1.27,-5.08) 7(-1.27,5.08) 7(1.27,-5.08) 7(1.27,5.08)
Top Overlay:
  lines w0.2: -2.5,-4.2 -2.5,-5.23 -2.259,-5.23 ; -2.5,4.2 -2.5,5.23 -2.259,5.23 ; -1.745,-4.2 -2.8,-4.2 -2.8,4.2 -1.745,4.2 ; -0.795,-4.2 0.795,-4.2 ; -0.795,4.2 0.795,4.2 ; -0.281,-5.23 0.281,-5.23 ; -0.281,5.23 0.281,5.23 ; 1.745,-4.2 2.8,-4.2 2.8,4.2 1.745,4.2 ; 2.259,-5.23 2.5,-5.23 2.5,-4.2 ; 2.259,5.23 2.5,5.23 2.5,4.2 ; -2.5,-3.9 2.5,-3.9 2.5,3.9 -2.5,3.9 -2.5,-3.9
Mechanical 8:
  lines w0.1: -1.27,-5.08 1.27,-5.08 ; -1.27,-2.54 1.27,-2.54 ; -1.27,0 1.27,0 ; -1.27,2.54 1.27,2.54 ; -1.27,5.08 1.27,5.08
Mechanical 14:
  circle w0.1: c0,0 r2.5
  lines w0.1: -2.8,-1 -2.5,-1 ; -2.8,1 -2.5,1 ; -2.5,-4.2 -2.5,-5.23 2.5,-5.23 2.5,-4.2 ; -2.5,4.2 -2.5,5.23 2.5,5.23 2.5,4.2 ; -1.1,1.02 ccw(c0,0) 1.1,1.02 ; 2.5,-1 2.8,-1 ; 2.5,1 2.8,1 ; -2.8,-4.2 2.8,-4.2 2.8,4.2 -2.8,4.2 -2.8,-4.2 ; -2.5,-3.9 -2.5,3.9 2.5,3.9 2.5,-3.9 -2.5,-3.9 ; -1.47,-5.23 -1.07,-5.23 -1.07,-4.93 -1.47,-4.93 -1.47,-5.23 ; -1.47,-2.84 -1.07,-2.84 -1.07,-2.24 -1.47,-2.24 -1.47,-2.84 ; -1.47,-0.3 -1.07,-0.3 -1.07,0.3 -1.47,0.3 -1.47,-0.3 ; -1.47,2.24 -1.07,2.24 -1.07,2.84 -1.47,2.84 -1.47,2.24 ; -1.47,4.93 -1.07,4.93 -1.07,5.23 -1.47,5.23 -1.47,4.93 ; -1.1,0 ccw(c0,0) 1.1,0 1.1,1.551 ccw(c0,1.551) -1.1,1.551 -1.1,0 ; 1.07,-5.23 1.47,-5.23 1.47,-4.93 1.07,-4.93 1.07,-5.23 ; 1.07,-2.84 1.47,-2.84 1.47,-2.24 1.07,-2.24 1.07,-2.84 ; 1.07,-0.3 1.47,-0.3 1.47,0.3 1.07,0.3 1.07,-0.3 ; 1.07,2.24 1.47,2.24 1.47,2.84 1.07,2.84 1.07,2.24 ; 1.07,4.93 1.47,4.93 1.47,5.23 1.07,5.23 1.07,4.93
  text "4" at 1.638,-3.04 h1
  text "1" at -2.119,-3.05 h1
  text "2" at -2.333,-0.51 h1
  text "5" at 1.662,-0.5 h1
  text "6" at 1.685,2.04 h1
  text "3" at -2.333,2.03 h1
3D body "SW_OMRON_A9T21-0014.stp": height 16.82, standoff -3, extent -2.8,-5.23 2.8,5.23

## SW_TYCO_1-1437575-4 [mm] "Body 8.79 x 3.4mm, SPDT Slide Low Profile Switch, SSA Series"
height 5.4
pads (3):
  round 1.8 hole 1.1: 1(-2.489,0) 2(0,0) 3(2.489,0)
Top Overlay:
  lines w0.2: -1.746,-1.003 -0.745,-1.003 ; -1.746,1.003 -0.745,1.003 ; -4.394,-1.702 -4.394,1.702 4.394,1.702 4.394,-1.702 -4.394,-1.702
Mechanical 8:
  lines w0.1: -2.989,0 -2.489,0 ; -2.489,-0.5 -2.489,0 ; -2.489,0.5 -2.489,0 ; -1.989,0 -2.489,0 ; -0.5,0 0,0 ; 0,-0.5 0,0 ; 0,0.5 0,0 ; 0.5,0 0,0 ; 1.989,0 2.489,0 ; 2.489,-0.5 2.489,0 ; 2.489,0.5 2.489,0 ; 2.989,0 2.489,0
Mechanical 14:
  lines w0.1: -2.145,-1.003 -2.145,1.003 ; -1.945,-1.003 -1.945,1.003 ; -1.745,-1.003 -1.745,1.003 ; -1.545,-1.003 -1.545,1.003 ; -1.345,-1.003 -1.345,1.003 ; -1.145,-1.003 -1.145,1.003 ; -0.945,-1.003 -0.945,1.003 ; -0.745,-1.003 -0.745,1.003 ; -0.545,-1.003 -0.545,1.003 ; -0.345,-1.003 -0.345,1.003 ; -0.241,-1.003 -0.241,1.003 ; -2.248,-1.003 -2.248,1.003 ; -2.248,-1.003 -2.248,1.003 ; -2.248,-1.003 2.248,-1.003 2.248,1.003 -2.248,1.003 ; -4.394,-1.702 -4.394,1.702 4.394,1.702 4.394,-1.702 -4.394,-1.702
3D body "SW_TYCO_1-1437575-4.stp": height 5.4, standoff -3.2, extent -4.394,-1.702 4.394,1.702

## SW_TYCO_1-1571983-0 [mm] "Pitch 1.27mm,  Body 11.28x6.2mm, 8 Ways SPST Surface-Mount DIP Switch, TYCO GDH Serie"
height 2.31
pads (16):
  rect 1.55x0.55 smd: 1(-3.8,4.445) 2(-3.8,3.175) 3(-3.8,1.905) 4(-3.8,0.635) 5(-3.8,-0.635) 6(-3.8,-1.905) 7(-3.8,-3.175) 8(-3.8,-4.445) 9(3.8,-4.445) 10(3.8,-3.175) 11(3.8,-1.905) 12(3.8,-0.635) 13(3.8,0.635) 14(3.8,1.905) 15(3.8,3.175) 16(3.8,4.445)
Top Overlay:
  circle w0.25: c-4.3,5.25 r0.125
  region: -0.9,-3.945 -0.9,-4.845 0,-4.845 0,-3.945
  region: -0.9,-2.675 -0.9,-3.575 0,-3.575 0,-2.675
  region: -0.9,-1.405 -0.9,-2.305 0,-2.305 0,-1.405
  region: -0.9,-0.135 -0.9,-1.035 0,-1.035 0,-0.135
  region: -0.9,4.945 -0.9,4.045 0,4.045 0,4.945
  region: -0.9,3.675 -0.9,2.775 0,2.775 0,3.675
  region: -0.9,2.405 -0.9,1.505 0,1.505 0,2.405
  region: -0.9,1.135 -0.9,0.235 0,0.235 0,1.135
  lines w0.2: -2.7,-5.65 2.7,-5.65 2.7,5.65 -2.7,5.65 -2.7,-5.65 ; -0.9,-4.845 -0.9,-3.945 0.9,-3.945 0.9,-4.845 -0.9,-4.845 ; -0.9,-3.575 -0.9,-2.675 0.9,-2.675 0.9,-3.575 -0.9,-3.575 ; -0.9,-2.305 -0.9,-1.405 0.9,-1.405 0.9,-2.305 -0.9,-2.305 ; -0.9,-1.035 -0.9,-0.135 0.9,-0.135 0.9,-1.035 -0.9,-1.035 ; -0.9,0.235 -0.9,1.135 0.9,1.135 0.9,0.235 -0.9,0.235 ; -0.9,1.505 -0.9,2.405 0.9,2.405 0.9,1.505 -0.9,1.505 ; -0.9,2.775 -0.9,3.675 0.9,3.675 0.9,2.775 -0.9,2.775 ; -0.9,4.045 -0.9,4.945 0.9,4.945 0.9,4.045 -0.9,4.045
  text "8" at -2.286,-4.191 h1
  text "7" at -2.286,-2.921 h1
  text "6" at -2.286,-1.651 h1
  text "5" at -2.286,-0.381 h1
  text "4" at -2.286,0.889 h1
  text "3" at -2.286,2.159 h1
  text "ON" at 1.27,5.08 h1
  text "2" at -2.286,3.429 h1
  text "1" at -2.286,4.699 h1
Mechanical 14:
  region: -0.9,-3.945 -0.9,-4.845 0,-4.845 0,-3.945
  region: -0.9,-2.675 -0.9,-3.575 0,-3.575 0,-2.675
  region: -0.9,-1.405 -0.9,-2.305 0,-2.305 0,-1.405
  region: -0.9,-0.135 -0.9,-1.035 0,-1.035 0,-0.135
  region: -0.9,4.945 -0.9,4.045 0,4.045 0,4.945
  region: -0.9,3.675 -0.9,2.775 0,2.775 0,3.675
  region: -0.9,2.405 -0.9,1.505 0,1.505 0,2.405
  region: -0.9,1.135 -0.9,0.235 0,0.235 0,1.135
  lines w0.1: -3.1,-5.64 -3.1,5.64 3.1,5.64 3.1,-5.64 -3.1,-5.64 ; -0.9,-4.845 -0.9,-3.945 0.9,-3.945 0.9,-4.845 -0.9,-4.845 ; -0.9,-3.575 -0.9,-2.675 0.9,-2.675 0.9,-3.575 -0.9,-3.575 ; -0.9,-2.305 -0.9,-1.405 0.9,-1.405 0.9,-2.305 -0.9,-2.305 ; -0.9,-1.035 -0.9,-0.135 0.9,-0.135 0.9,-1.035 -0.9,-1.035 ; -0.9,0.235 -0.9,1.135 0.9,1.135 0.9,0.235 -0.9,0.235 ; -0.9,1.505 -0.9,2.405 0.9,2.405 0.9,1.505 -0.9,1.505 ; -0.9,2.775 -0.9,3.675 0.9,3.675 0.9,2.775 -0.9,2.775 ; -0.9,4.045 -0.9,4.945 0.9,4.945 0.9,4.045 -0.9,4.045
  text "8" at -2.276,-4.191 h1
  text "7" at -2.276,-2.921 h1
  text "6" at -2.276,-1.651 h1
  text "5" at -2.276,-0.381 h1
  text "4" at -2.276,0.889 h1
  text "3" at -2.276,2.159 h1
  text "ON" at 1.28,5.08 h1
  text "2" at -2.276,3.429 h1
  text "1" at -2.276,4.699 h1
Mechanical 15:
  lines w0.05: -0.5,0 0.5,0 ; 0,-0.5 0,0.5 ; -4.85,-6.05 -4.85,6.05 4.85,6.05 4.85,-6.05 -4.85,-6.05
3D body "SW_TYCO_1-1571983-0.stp": height 2.36, standoff 0, extent -4.06,-5.641 4.061,5.639